# Altium footprint library 我的元件库01.PcbLib: 321 footprints (part 9 of 21)
Each footprint in its own frame and in the unit in brackets; x right, y up, seen from the top. Pads: shape width x height; smd on the part's side, far side on the other; paste and mask are expansions set on the pad; w line width, h text height; cw(c..) or ccw(c..) is an arc to the next point about the centre after c.
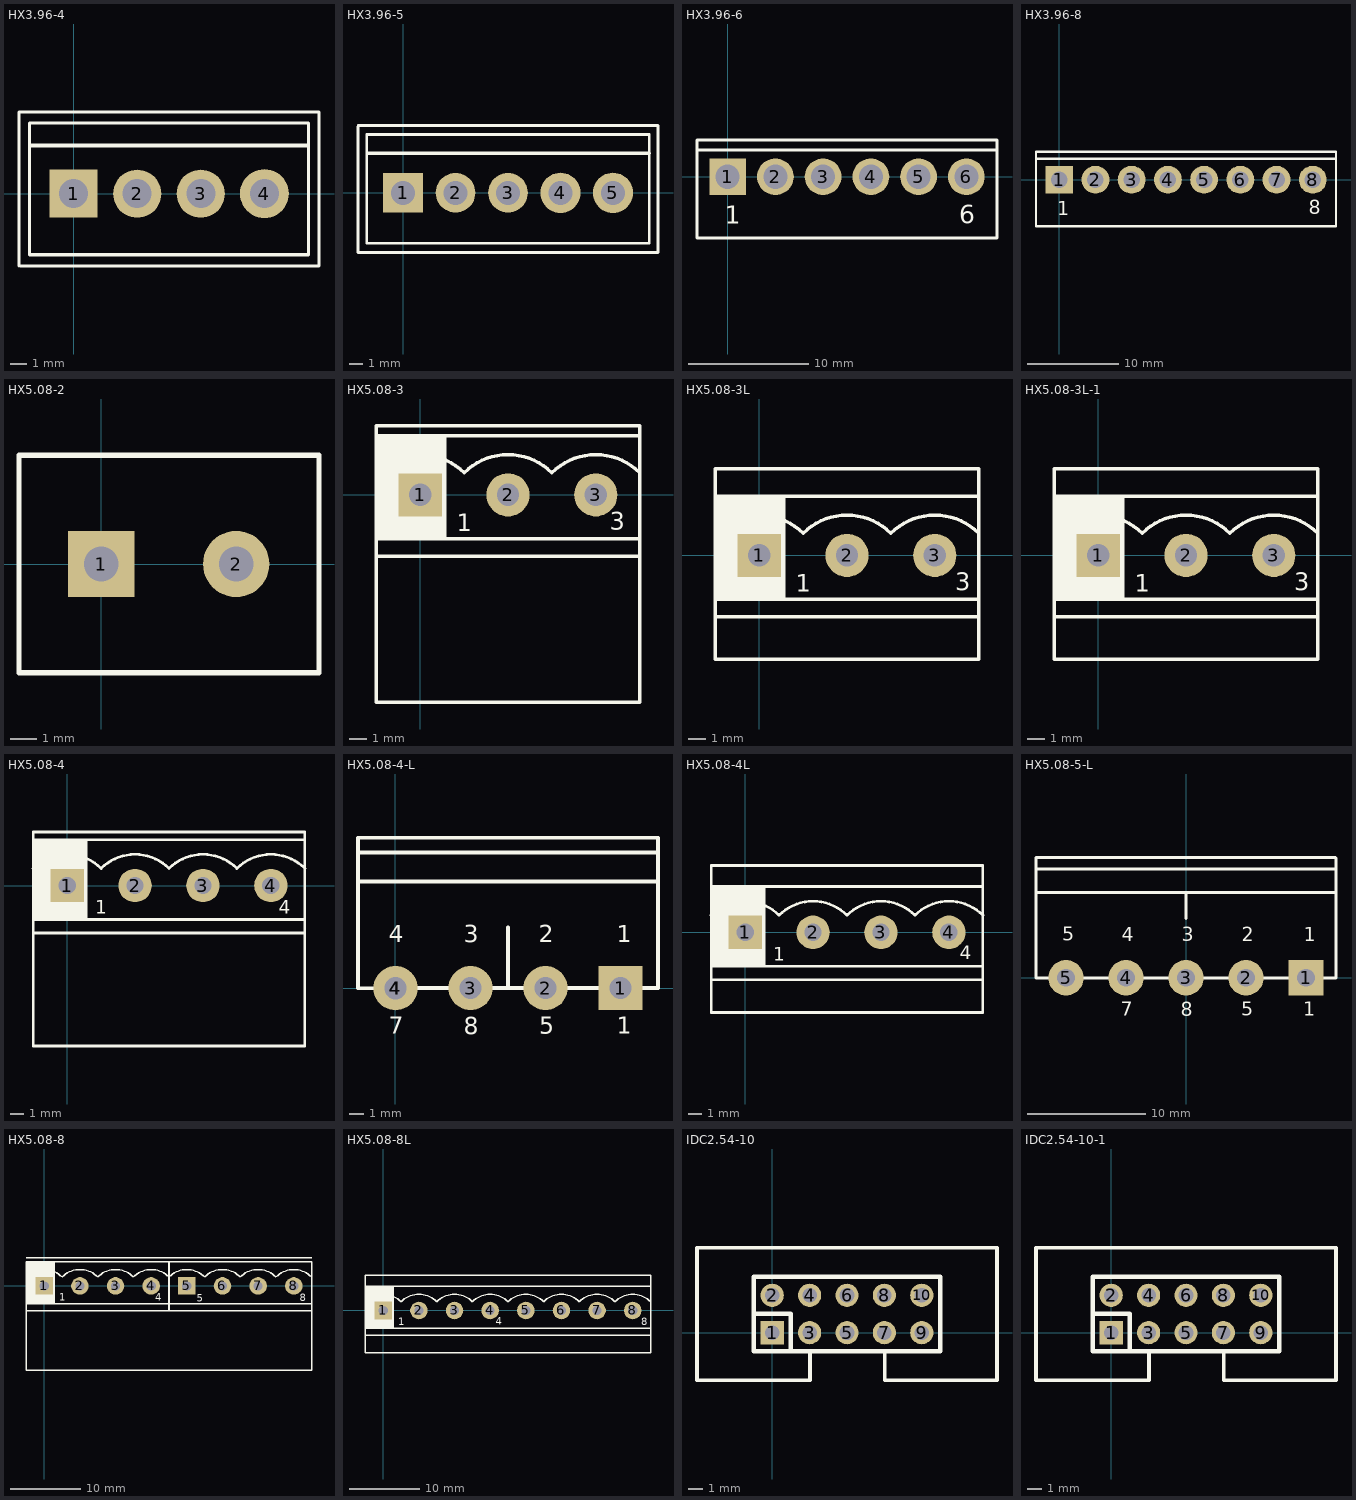
[diagram p8: the footprints below, top view; thin cyan lines are the x and y axes]

## HX3.96-4 [mm]
pads (4):
  rect 3x3 hole 1.8: 1(0,0)
  round 3 hole 1.8: 2(3.96,0) 3(7.92,0)
  round 3.048 hole 1.8: 4(11.88,0)
Top Overlay:
  lines w0.203: -3.4,-4.5 -3.4,5 ; -3.387,5.08 15.28,5.08 15.28,-4.445 ; -3.3,-4.5 15.28,-4.5 ; 14.6,-3.8 -2.75,-3.8 -2.75,4.4 14.6,4.4 ; 14.63,-3.8 14.63,4.4
  lines w0.254: -2.7,3 14.6,3

## HX3.96-5 [mm]
pads (5):
  rect 3x3 hole 1.8: 1(0,0)
  round 3 hole 1.8: 2(3.96,0) 3(7.92,0)
  round 3.048 hole 1.8: 4(11.88,0) 5(15.84,0)
Top Overlay:
  lines w0.203: -3.4,-4.5 -3.4,5 ; -3.387,5.08 19.24,5.08 19.24,-4.445 ; -3.3,-4.5 19.24,-4.5 ; -2.75,-3.8 18.59,-3.8 18.59,4.4 -2.75,4.4 -2.75,-3.8
  lines w0.254: -2.7,3 18.59,3

## HX3.96-6 [mil]
pads (6):
  rect 120x120 hole 78.74: 1(0,0)
  round 120 hole 78.74: 2(155.91,0) 3(311.81,0) 4(467.72,0) 5(623.62,0) 6(779.53,0)
Top Overlay:
  lines w10: -100,88 879.53,88 ; -100,-200 -100,120 879.53,120 879.53,-200 -100,-200
  text "6" at 757,-152 h60
  text "1" at -10,-153 h60

## HX3.96-8 [mil]
pads (8):
  rect 120x120 hole 70.87: 1(0,0)
  round 120 hole 70.87: 2(155.91,0) 3(311.81,0) 4(467.72,0) 5(623.62,0) 6(779.53,0) 7(935.43,0) 8(1091.34,0)
Top Overlay:
  lines w10: -100,90 1191.34,90 ; -100,-200 1191.34,-200 1191.34,120 -100,120 -100,-200
  text "8" at 1075,-149 h60
  text "1" at -9,-152 h60

## HX5.08-2 [mm]
pads (2):
  rect 2.5x2.5 hole 1.3: 1(0,0)
  round 2.5 hole 1.3: 2(5.08,0)
Top Overlay:
  lines w0.203: -3.1,-4.1 -3.1,4.1 8.2,4.1 8.2,-4.1 -3.1,-4.1
3D body "terminal_blocks_a-tb508-tc02.stp": height 2.31, standoff -11.04, extent -3.105,-3.4 8.255,4.1

## HX5.08-3 [mm]
pads (3):
  rect 2.5x2.5 hole 1.3: 1(0,0)
  round 2.5 hole 1.3: 2(5.08,0) 3(10.16,0)
Top Overlay:
  rectangle: -2.54,-2.54 1.524,3.429
  lines w0.203: -2.544,1.274 cw(c0,-1.27) 2.544,1.274 ; -2.54,-3.556 12.7,-3.556 ; -2.54,-2.54 12.7,-2.54 ; -2.54,3.429 12.7,3.429 ; 2.536,1.274 cw(c5.08,-1.27) 7.624,1.274 ; 7.616,1.274 cw(c10.16,-1.27) 12.704,1.274 ; -2.54,-12 -2.54,4 12.7,4 12.7,-12 -2.54,-12
  text "1" at 2.108,-2.108 h1.02
  text "3" at 10.973,-2.032 h1.02

## HX5.08-3L [mm]
pads (3):
  rect 2.5x2.5 hole 1.3: 1(0,0)
  round 2.5 hole 1.3: 2(5.08,0) 3(10.16,0)
Top Overlay:
  rectangle: -2.54,-2.54 1.524,3.429
  lines w0.203: -2.544,1.274 cw(c0,-1.27) 2.544,1.274 ; -2.54,-3.556 12.7,-3.556 ; -2.54,-2.54 12.7,-2.54 ; -2.54,3.429 12.7,3.429 ; 2.536,1.274 cw(c5.08,-1.27) 7.624,1.274 ; 7.616,1.274 cw(c10.16,-1.27) 12.704,1.274 ; -2.54,-6 -2.54,5 12.7,5 12.7,-6 -2.54,-6
  text "1" at 2.108,-2.108 h1.02
  text "3" at 11.328,-2.032 h1.02
3D body "SW3dPS-CN_BT_1X3.STEP": height 10.05, standoff -2.24, extent -2.949,-3.835 12.551,3.865

## HX5.08-3L-1 [mm]
pads (3):
  rect 2.5x2.5 hole 1.3: 1(0,0)
  round 2.5 hole 1.3: 2(5.08,0) 3(10.16,0)
Top Overlay:
  rectangle: -2.54,-2.54 1.524,3.429
  lines w0.203: -2.544,1.274 cw(c0,-1.27) 2.544,1.274 ; -2.54,-3.556 12.7,-3.556 ; -2.54,-2.54 12.7,-2.54 ; -2.54,3.429 12.7,3.429 ; 2.536,1.274 cw(c5.08,-1.27) 7.624,1.274 ; 7.616,1.274 cw(c10.16,-1.27) 12.704,1.274 ; -2.54,-6 12.7,-6 12.7,5 -2.54,5 -2.54,-6
  text "3" at 11.328,-2.032 h1.02
  text "1" at 2.108,-2.108 h1.02
3D body "User Library-Orange 3w Plug 5_08mm.STEP": height 12, standoff -5, extent -3.565,-4.699 13.675,3.801

## HX5.08-4 [mm]
pads (4):
  rect 2.5x2.5 hole 1.3: 1(0,0)
  round 2.5 hole 1.3: 2(5.08,0) 3(10.16,0) 4(15.24,0)
Top Overlay:
  rectangle: -2.54,-2.54 1.524,3.429
  lines w0.203: -2.544,1.274 cw(c0,-1.27) 2.544,1.274 ; -2.54,-3.556 17.78,-3.556 ; -2.54,-2.54 17.78,-2.54 ; -2.54,3.429 17.78,3.429 ; 2.536,1.274 cw(c5.08,-1.27) 7.624,1.274 ; 7.616,1.274 cw(c10.16,-1.27) 12.704,1.274 ; 12.696,1.274 cw(c15.24,-1.27) 17.784,1.274 ; 17.776,-3.556 17.776,3.429 ; -2.54,-12 17.78,-12 17.78,4 -2.54,4 -2.54,-12
  text "4" at 15.824,-2.108 h1.02
  text "1" at 2.108,-2.108 h1.02

## HX5.08-4-L [mm]
height 8
pads (5):
  rect 3x3 hole 1.5: 1(15.248,0.012)
  round 3 hole 1.5: 2(10.168,0.012) 3(5.088,0.012) 4(0,0) 4(0.008,0.012)
Top Overlay:
  lines w0.254: -2.476,9.195 17.788,9.195 ; -2.444,7.239 17.788,7.239 ; 0,0 -2.54,0 -2.54,10.2 17.74,10.2 ; 0.008,0.012 17.788,0.012 17.788,10.172 ; 2.54,0 5.08,0 ; 7.62,0.051 7.62,4.115
  text "8" at 4.623,-3.531 h2
  text "7" at -0.457,-3.505 h2
  text "1" at 14.986,-3.505 h2
  text "5" at 9.754,-3.48 h2
  text "4" at -0.457,2.718 h2
  text "3" at 4.623,2.718 h2
  text "2" at 9.703,2.718 h2
  text "1" at 14.986,2.718 h2

## HX5.08-4L [mm]
pads (4):
  rect 2.5x2.5 hole 1.3: 1(0,0)
  round 2.5 hole 1.3: 2(5.08,0) 3(10.16,0) 4(15.24,0)
Top Overlay:
  rectangle: -2.54,-2.54 1.524,3.429
  lines w0.203: -2.544,1.274 cw(c0,-1.27) 2.544,1.274 ; -2.54,-3.556 17.78,-3.556 ; -2.54,-2.54 17.78,-2.54 ; -2.54,3.429 17.78,3.429 ; 2.536,1.274 cw(c5.08,-1.27) 7.624,1.274 ; 7.616,1.274 cw(c10.16,-1.27) 12.704,1.274 ; 12.696,1.274 cw(c15.24,-1.27) 17.784,1.274 ; -2.54,-6 17.78,-6 17.78,5 -2.54,5 -2.54,-6
  text "4" at 16.053,-2.032 h1.02
  text "1" at 2.108,-2.108 h1.02
3D body "User Library-Green 4w Plug 5_08mm PCB.STEP": height 12, standoff -3.6, extent -3.246,-4.445 18.994,3.905

## HX5.08-5-L [mm]
height 8
pads (5):
  rect 3x3 hole 1.5: 1(10.16,0)
  round 3 hole 1.5: 2(5.08,0) 3(0,0) 4(-5.08,0) 5(-10.16,0)
Top Overlay:
  lines w0.254: -12.7,7.2 12.612,7.2 ; -12.7,9.2 12.644,9.2 ; 0,5 0,7.2 ; 12.66,10.2 -12.7,10.2 -12.7,0 -10.16,0 -5.08,0 12.7,0 12.7,10.16
  text "1" at 9.982,2.718 h2
  text "2" at 4.699,2.718 h2
  text "3" at -0.381,2.718 h2
  text "4" at -5.461,2.718 h2
  text "5" at -10.465,2.743 h2
  text "5" at 4.674,-3.581 h2
  text "1" at 9.906,-3.607 h2
  text "7" at -5.537,-3.607 h2
  text "8" at -0.457,-3.632 h2

## HX5.08-8 [mm]
pads (8):
  rect 2.5x2.5 hole 1.3: 1(0,0) 5(20.316,0)
  round 2.5 hole 1.3: 2(5.08,0) 3(10.16,0) 4(15.24,0) 6(25.4,0) 7(30.48,0) 8(35.56,0)
Top Overlay:
  rectangle: -2.54,-2.54 1.524,3.429
  lines w0.203: -2.544,1.274 cw(c0,-1.27) 2.544,1.274 ; -2.54,-3.556 17.78,-3.556 17.78,3.429 -2.54,3.429 -2.54,-12 38.1,-12 38.1,3.429 ; -2.54,-2.54 17.78,-2.54 ; -2.54,4 38.1,4 ; 2.536,1.274 cw(c5.08,-1.27) 7.624,1.274 ; 7.616,1.274 cw(c10.16,-1.27) 12.704,1.274 ; 12.696,1.274 cw(c15.24,-1.27) 17.784,1.274 ; 17.771,1.274 cw(c20.316,-1.27) 22.86,1.274 ; 17.776,-2.54 38.096,-2.54 ; 22.851,1.274 cw(c25.396,-1.27) 27.94,1.274 ; 27.931,1.274 cw(c30.476,-1.27) 33.02,1.274 ; 33.011,1.274 cw(c35.556,-1.27) 38.1,1.274 ; 38.096,-3.556 17.776,-3.556 17.776,3.429 38.096,3.429
  text "8" at 36.424,-2.21 h1.02
  text "5" at 21.717,-2.261 h1.02
  text "4" at 15.824,-2.108 h1.02
  text "1" at 2.108,-2.108 h1.02

## HX5.08-8L [mm]
pads (8):
  rect 2.5x2.5 hole 1.3: 1(0,0)
  round 2.5 hole 1.3: 2(5.08,0) 3(10.16,0) 4(15.24,0) 5(20.32,0) 6(25.4,0) 7(30.48,0) 8(35.56,0)
Top Overlay:
  rectangle: -2.54,-2.54 1.524,3.429
  lines w0.203: -2.544,1.274 cw(c0,-1.27) 2.544,1.274 ; -2.54,-3.556 38.1,-3.556 ; -2.54,-2.54 38.1,-2.54 ; -2.54,3.429 38.1,3.429 ; 2.536,1.274 cw(c5.08,-1.27) 7.624,1.274 ; 7.616,1.274 cw(c10.16,-1.27) 12.704,1.274 ; 12.696,1.274 cw(c15.24,-1.27) 17.784,1.274 ; 17.776,1.274 cw(c20.32,-1.27) 22.864,1.274 ; 22.856,1.274 cw(c25.4,-1.27) 27.944,1.274 ; 27.936,1.274 cw(c30.48,-1.27) 33.024,1.274 ; 33.016,1.274 cw(c35.56,-1.27) 38.104,1.274 ; -2.54,-6 38.1,-6 38.1,5 -2.54,5 -2.54,-6
  text "8" at 36.779,-2.083 h1.02
  text "4" at 16.053,-2.032 h1.02
  text "1" at 2.108,-2.108 h1.02

## IDC2.54-10 [mil]
pads (10):
  rect 62x62 hole 39.37: 1(0,0)
  round 62 hole 39.37: 2(0,100) 3(100,0) 4(100,100) 5(200,0) 6(200,100) 7(300,0) 8(300,100) 9(400,0) 10(400,100)
Top Overlay:
  lines w10: 101,-50 101,-127.17 -201.18,-127.17 -201.18,227.16 601.18,227.16 ; 301,-50 301,-127.17 601.18,-127.17 ; 601,-127.33 601,227
  lines w12: -50,50 50,50 50,-50 ; -50,-50 450,-50 450,150 -50,150 -50,-50
3D body "SW3dPS-HDB-10.STEP": height 366.14, standoff -98.43, extent -196.64,-128.08 598.64,242

## IDC2.54-10-1 [mil]
pads (10):
  rect 62x62 hole 39.37: 1(0,0)
  round 62 hole 39.37: 2(0,100) 3(100,0) 4(100,100) 5(200,0) 6(200,100) 7(300,0) 8(300,100) 9(400,0) 10(400,100)
Top Overlay:
  lines w10: 101,-50 101,-127.17 -201.18,-127.17 -201.18,227.16 601.18,227.16 ; 301,-50 301,-127.17 601.18,-127.17 ; 601,-127.33 601,227
  lines w12: -50,50 50,50 50,-50 ; -50,-50 450,-50 450,150 -50,150 -50,-50
3D body "SW3dPS-Tyco - 5103308-1 (Shrouded Header 2.54mm 10 Pin).STEP": height 388, standoff -120, extent -198,-130 602,230